# Altium footprint library SMPSProject.PcbLib: 143 footprints (part 5 of 9)
Each footprint in its own frame and in the unit in brackets; x right, y up, seen from the top. Pads: shape width x height; smd on the part's side, far side on the other; paste and mask are expansions set on the pad; w line width, h text height; cw(c..) or ccw(c..) is an arc to the next point about the centre after c.
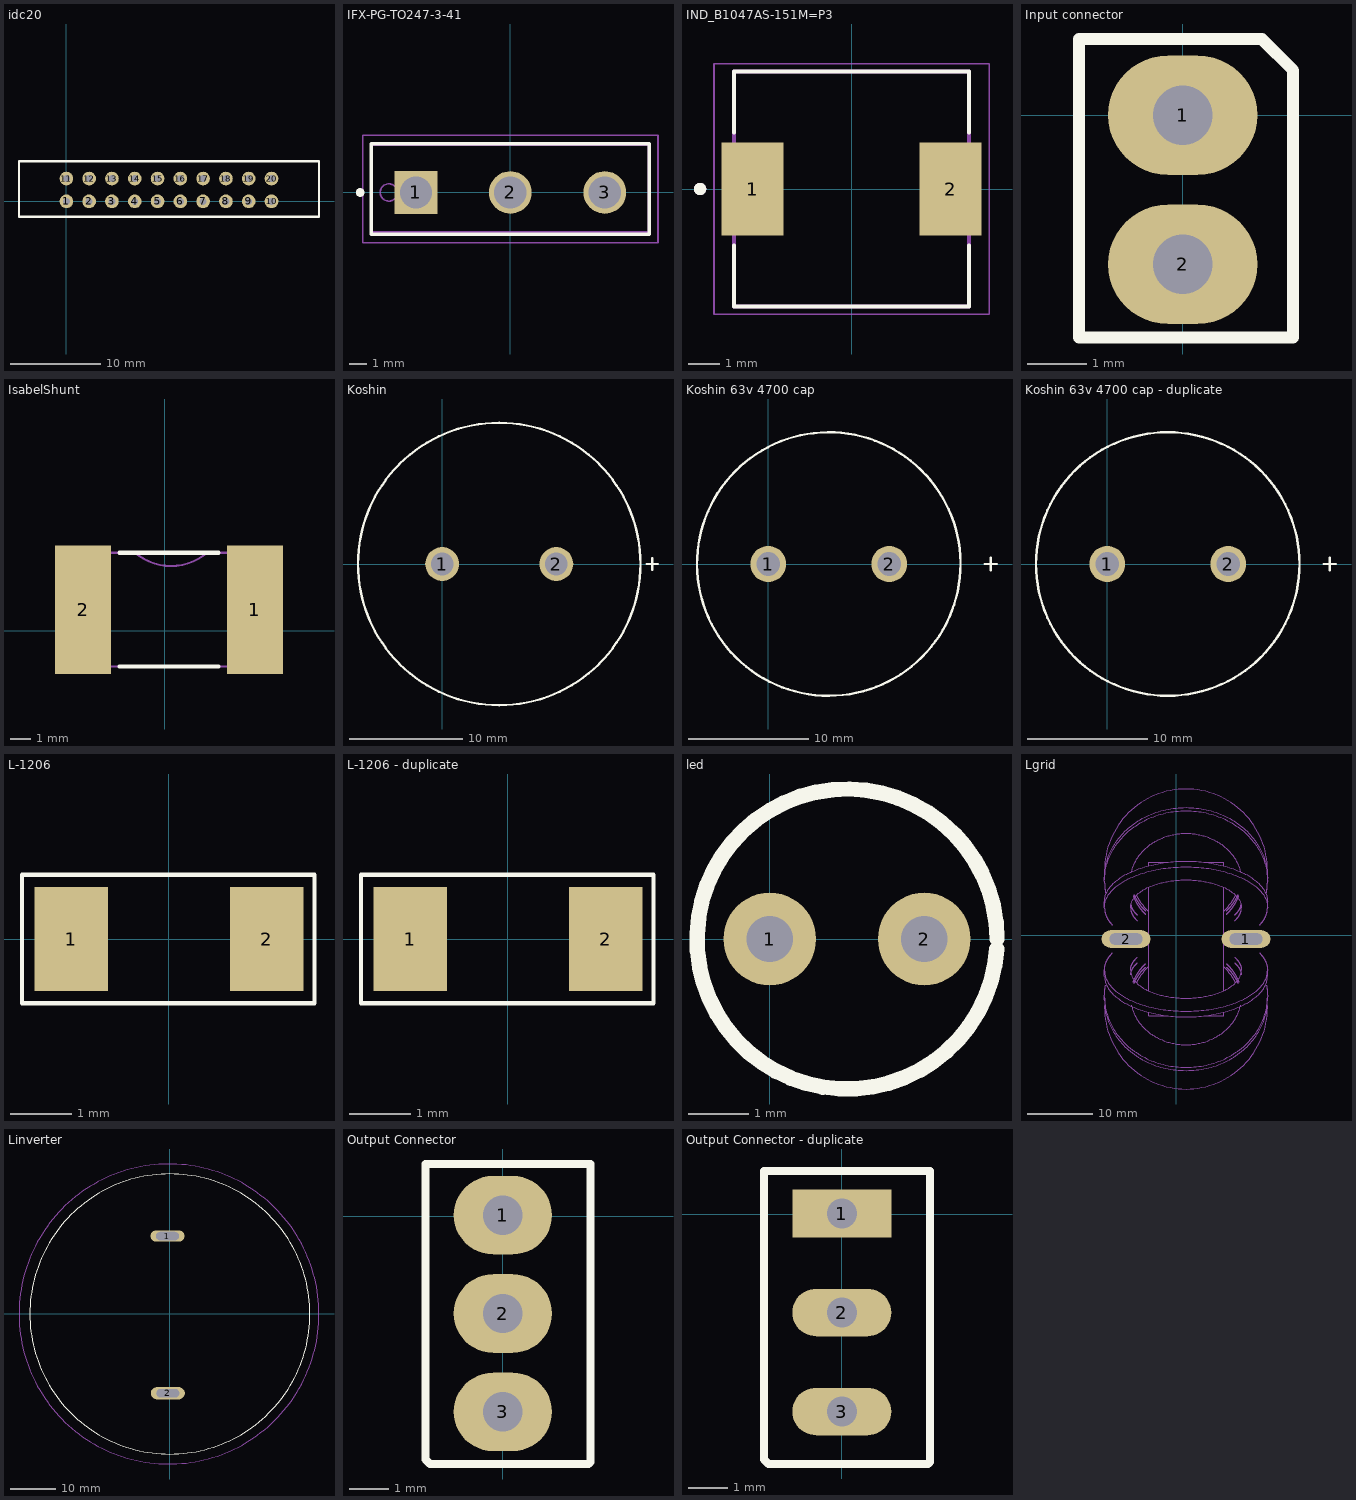
[diagram p4: the footprints below, top view; thin cyan lines are the x and y axes]

## idc20 [mil]
pads (20):
  round 60 hole 30: 1(0,0) 2(100,0) 3(200,0) 4(300,0) 5(400,0) 6(500,0) 7(600,0) 8(700,0) 9(800,0) 10(900,0) 11(0,100) 12(100,100) 13(200,100) 14(300,100) 15(400,100) 16(500,100) 17(600,100) 18(700,100) 19(800,100) 20(900,100)
Top Overlay:
  lines w10: -207.8,-67.76 -169.57,-67.76 1108.36,-67.76 1108.36,176.18 -207.8,176.18 -207.8,-29.53 -207.8,-67.76
3D body "20-Pin Shrouded Header (IDC) Straight.stp": height 350.5, standoff -167.85, extent -125,-138.78 1025,230.16

## IFX-PG-TO247-3-41 [mm] "TO247-Diode; 3 pin, 5.44 mm pitch, 15.90 mm L X 5.00 mm W X 26.00 mm H body"
height 26
pads (3):
  rect 2.46x2.46 hole 1.86 paste+0 mask+0: 1(-5.44,0)
  round 2.46 hole 1.86 paste+0 mask+0: 2(0,0) 3(5.44,0)
Top Overlay:
  circle w0.25: c-8.65,0 r0.125
  lines w0.2: -8,-2.4 8,-2.4 8,2.8 -8,2.8 -8,-2.4
Mechanical 3:
  text ".DESIGNATOR" at 0,0 h1.2
Mechanical 13:
  circle w0.1: c-7,0 r0.5
  lines w0.1: -7.95,-2.282 -7.95,2.718 7.95,2.718 7.95,-2.282 -7.95,-2.282
Mechanical 15:
  lines w0.1: -0.5,0 0.5,0 ; 0,-0.5 0,0.5 ; -8.5,-2.9 8.5,-2.9 8.5,3.3 -8.5,3.3 -8.5,-2.9
3D body "AIDW10S65C5.STEP": height 26, standoff -15.9, extent -7.95,-2.232 7.95,2.768

## IND_B1047AS-151M=P3 [mm]
pads (2):
  rect 2x3 smd: 1(-3.2,0) 2(3.2,0)
Top Overlay:
  circle w0.2: c-4.9,0 r0.1
  lines w0.127: -3.8,-1.82 -3.8,-3.8 3.8,-3.8 3.8,-1.82 ; -3.8,1.82 -3.8,3.8 3.8,3.8 3.8,1.82
Mechanical 13:
  circle w0.2: c-4.9,0 r0.1
  lines w0.127: -3.8,-3.8 -3.8,3.8 3.8,3.8 3.8,-3.8 -3.8,-3.8
Mechanical 15:
  lines w0.05: -4.45,-4.05 -4.45,4.05 4.45,4.05 4.45,-4.05 -4.45,-4.05
3D body "B1047AS-221M=P3--3DModel-STEP-46669.STEP": height 5.01, standoff 0.01, extent -3.8,-3.8 3.8,3.8

## Input connector [mm]
pads (2):
  oval 2.5x2 hole 1: 1(0,0) 2(0,-2.5)
Top Overlay:
  lines w0.2: 0.6,1.275 1.325,1.275 1.85,0.75 1.85,-3.725 -1.74,-3.725 -1.74,1.275 0.65,1.275
3D body "User Library-Header_Male_2Pin.STEP": height 8.54, standoff -3, extent -1.245,-3.77 1.245,1.31

## IsabelShunt [mm]
pads (2):
  rect 2.7x6.2 smd: 1(4.359,1.017) 2(-3.941,1.017)
Top Overlay:
  lines w0.2: -2.191,-1.733 2.609,-1.733 ; -2.191,3.767 2.609,3.767
Mechanical 5:
  lines w0.1: -4.941,-1.733 -4.941,3.767 -1.441,3.767 ccw(c0.309,5.826) 2.059,3.767 5.359,3.767 5.359,-1.733 -4.941,-1.733
3D body "3921.stp": height 1.05, standoff 0, extent -4.941,-1.733 5.359,3.767

## Koshin [mm]
pads (2):
  round 3 hole 2: 1(0,0) 2(10.1,0)
Top Overlay:
  circle w0.2: c5.05,0 r12.5
  lines w0.2: 18.082,0 19.098,0 ; 18.59,-0.508 18.59,0.508
3D body "U1-YY.step": height 49.77, standoff -5.58, extent -6.045,-11.176 15.951,10.82

## Koshin 63v 4700 cap [mm]
pads (2):
  round 3 hole 2: 1(0,0) 2(10.1,0)
Top Overlay:
  lines w0.2: 16.049,0.119 ccw(c5.05,0) 16.05,0 ; 18.082,0 19.098,0 ; 18.59,-0.508 18.59,0.508
3D body "U1-YY.step": height 49.77, standoff -5.58, extent -6.045,-11.176 15.951,10.82

## Koshin 63v 4700 cap - duplicate [mm]
pads (2):
  round 3 hole 2: 1(0,0) 2(10.1,0)
Top Overlay:
  circle w0.2: c5.05,0 r11
  lines w0.2: 18.082,0 19.098,0 ; 18.59,-0.508 18.59,0.508
3D body "U1-YY.step": height 49.77, standoff -5.58, extent -6.045,-11.176 15.951,10.82

## L-1206 [mm]
pads (2):
  rect 1.2x1.7 smd: 1(-1.6,0) 2(1.6,0)
Top Overlay:
  lines w0.07: -2.4,-1.05 -2.4,1.05 2.375,1.05 2.375,0.692 2.375,0.556 2.375,-0.531 2.375,-1.05 -2.4,-1.05
3D body "SML-LXLC1206.stp": height 1.11, standoff 0, extent -1.73,-0.8 1.476,0.8

## L-1206 - duplicate [mm]
pads (2):
  rect 1.2x1.7 smd: 1(-1.6,0) 2(1.6,0)
Top Overlay:
  lines w0.07: -2.4,-1.05 -2.4,1.05 2.375,1.05 2.375,0.692 2.375,0.556 2.375,-0.531 2.375,-1.05 -2.4,-1.05
3D body "SML-LXLC1206.stp": height 1.11, standoff 0, extent -1.73,-0.8 1.476,0.8

## led [mil]
pads (2):
  round 60 hole 30: 1(0,0) 2(100,0)
Top Overlay:
  lines w10: 146.87,-6.46 cw(c50,0) 147.08,0
3D body "LED 5mm.STEP": height 346.46, standoff -1062.99, extent -48.27,-125 168.27,111.19

## Lgrid [mm]
pads (2):
  oval 7.5x2.7 hole 1.8 slot 5 at 0 deg: 1(10.687,-0.59) 2(-7.713,-0.59)
Mechanical 5:
  drawing of 3628 lines, arcs and shapes, not listed
3D body "750343811.stp": height 48.01, standoff 0.01, extent -11.28,-23.59 13.72,22.41

## Linverter [mm]
pads (2):
  oval 7.5x2.5 hole 1.8 slot 5 at 0 deg: 1(-0.525,17.15)
  oval 7.5x2.7 hole 1.8 slot 5 at 0 deg: 2(-0.45,-17.45)
Top Overlay:
  circle w0.254: c0,0 r30.826
Top Assembly:
  circle w0.1: c-0.193,-0.007 r33.02
3D body "750343810.stp": height 43.89, standoff 0.01, extent -33.295,-33.265 32.745,32.765

## Output Connector [mm]
pads (3):
  oval 2.5x2 hole 1: 1(0,0.025) 2(0,-2.475) 3(0,-4.975)
Top Overlay:
  lines w0.2: -1.965,-6.185 -1.85,-6.3 0.45,-6.3 2.175,-6.3 2.225,-6.25 2.225,1.325 -1.965,1.325 -1.965,-6.185
3D body "Pin Header 1x3 TH Pitch 2.54mm.stp": height 9.21, standoff -3.49, extent -1.27,-6.245 1.27,1.375

## Output Connector - duplicate [mm]
pads (3):
  rect 2.5x1.2 hole 0.762 square: 1(0,0.025)
  oval 2.5x1.2 hole 0.762 square: 2(0,-2.475) 3(0,-4.975)
Top Overlay:
  lines w0.2: -1.965,-6.185 -1.85,-6.3 0.45,-6.3 2.175,-6.3 2.225,-6.25 2.225,1.1 -1.965,1.1 -1.965,-6.185

## PCBComponent_1 [mm]